# Altium footprint library RPSLib_orignal.PcbLib: 199 footprints (part 6 of 13)
Each footprint in its own frame and in the unit in brackets; x right, y up, seen from the top. Pads: shape width x height; smd on the part's side, far side on the other; paste and mask are expansions set on the pad; w line width, h text height; cw(c..) or ccw(c..) is an arc to the next point about the centre after c.
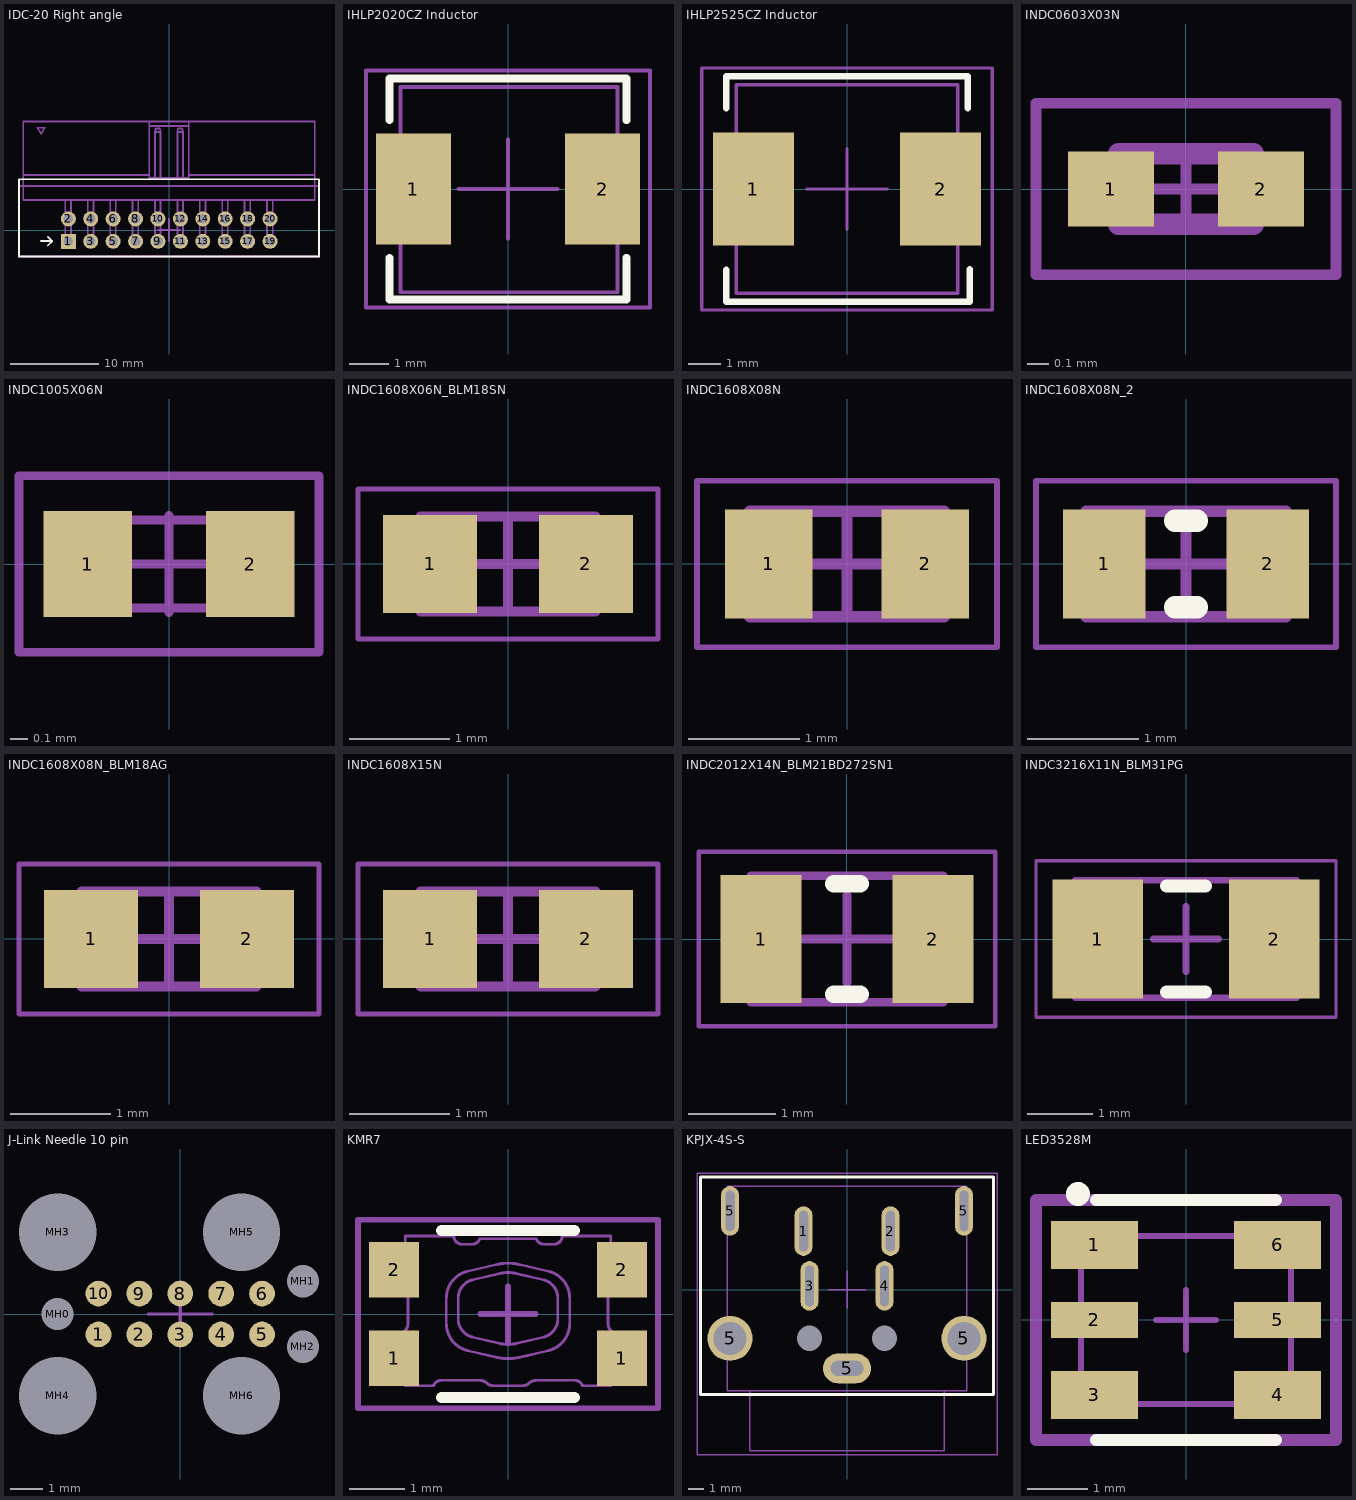
[diagram p5: the footprints below, top view; thin cyan lines are the x and y axes]

## IDC-20 Right angle [mm] "2.54 мм разъем правый"
height 9.1
pads (20):
  rect 1.7x1.7 hole 1.1: 1(-11.41,-1.27)
  round 1.7 hole 1.1: 2(-11.41,1.27) 3(-8.87,-1.27) 4(-8.87,1.27) 5(-6.33,-1.27) 6(-6.33,1.27) 7(-3.79,-1.27) 8(-3.79,1.27) 9(-1.25,-1.27) 10(-1.25,1.27) 11(1.29,-1.27) 12(1.29,1.27) 13(3.83,-1.27) 14(3.83,1.27) 15(6.37,-1.27) 16(6.37,1.27) 17(8.91,-1.27) 18(8.91,1.27) 19(11.45,-1.27) 20(11.45,1.27)
Top Overlay:
  lines w0.2: -14.5,-1.25 -13.25,-1.25 ; -13.75,-1.75 -13.25,-1.25 ; -13.75,-0.75 -13.25,-1.25 ; -17,-3 17,-3 17,5.75 -17,5.75 -17,-3
Mechanical 13:
  lines w0.2: -16.51,6.25 -2.25,6.25 ; -11.75,3.41 -11.75,-0.65 -11.75,-1.59 -11.11,-1.59 -11.11,-0.65 -11.11,3.41 ; -9.21,3.41 -9.21,-0.65 -9.21,-1.59 -8.57,-1.59 -8.57,-0.65 -8.57,3.41 ; -6.67,3.41 -6.67,-0.65 -6.67,-1.59 -6.03,-1.59 -6.03,-0.65 -6.03,3.41 ; -4.13,3.41 -4.13,-0.65 -4.13,-1.59 -3.49,-1.59 -3.49,-0.65 -3.49,3.41 ; -2.25,11.81 2.25,11.81 ; -1.59,3.41 -1.59,-0.65 -1.59,-1.59 -0.95,-1.59 -0.95,-0.65 -0.95,3.41 ; -1.59,5.91 -1.59,11.11 ; -0.95,5.91 -0.95,11.11 ; 0.95,3.41 0.95,-0.65 0.95,-1.59 1.59,-1.59 1.59,-0.65 1.59,3.41 ; 0.95,5.91 0.95,11.11 ; 1.59,5.91 1.59,11.11 ; 2.25,6.25 16.51,6.25 ; 3.49,3.41 3.49,-0.65 3.49,-1.59 4.13,-1.59 4.13,-0.65 4.13,3.41 ; 6.03,3.41 6.03,-0.65 6.03,-1.59 6.67,-1.59 6.67,-0.65 6.67,3.41 ; 8.57,3.41 8.57,-0.65 8.57,-1.59 9.21,-1.59 9.21,-0.65 9.21,3.41 ; 11.11,3.41 11.11,-0.65 11.11,-1.59 11.75,-1.59 11.75,-0.65 11.75,3.41 ; -2.25,12.31 -16.51,12.31 -16.51,3.41 16.51,3.41 16.51,12.31 2.25,12.31 ; -2.25,12.31 2.25,12.31 ; -2.25,12.31 -2.25,5.91 2.25,5.91 2.25,12.31 ; -1.59,11.11 -1.49,11.51 -1.05,11.51 -0.95,11.11 ; -1.59,11.11 -0.95,11.11 ; 0.95,11.11 1.05,11.51 1.49,11.51 1.59,11.11 ; 0.95,11.11 1.59,11.11 ; -14.91,11.61 -14.06,11.61 -14.485,10.874 -14.91,11.61
Mechanical 15:
  lines w0.2: -1.25,0 1.25,0 ; 0,-1.25 0,1.25 ; -17,-3 -17,5 17,5 17,-3 -17,-3
3D body "IDC-20 Right angle v2.stp": height 9, standoff -2.8, extent -16.51,-1.59 16.51,12.31

## IHLP2020CZ Inductor [mm]
height 3
pads (2):
  rect 1.9x2.8 smd mask+0.07: 1(-2.4,0) 2(2.4,0)
Top Overlay:
  lines w0.2: -3,-1.75 -3,-2.8 3,-2.8 3,-1.743 ; -3,1.75 -3,2.8 3,2.8 3,1.743
Mechanical 13:
  lines w0.1: -2.724,-2.615 2.776,-2.615 2.776,2.585 -2.724,2.585 -2.724,-2.615
Mechanical 15:
  lines w0.1: -1.25,0 1.25,0 ; 0,-1.25 0,1.25 ; -3.6,-3 -3.6,3 3.6,3 3.6,-3 -3.6,-3
3D body "User Library-IHLP2020CZ.step": height 3, standoff 0, extent -2.724,-2.615 2.776,2.585

## IHLP2525CZ Inductor [mm]
height 3
pads (2):
  rect 2.5x3.5 smd mask+0.07: 1(-2.9,0) 2(2.9,0)
Top Overlay:
  lines w0.2: -3.75,-2.5 -3.75,-3.5 3.801,-3.5 ; -3.75,2.5 -3.75,3.5 3.75,3.5 3.75,2.5 ; 3.801,-3.493 3.801,-2.493
Mechanical 13:
  lines w0.1: -3.43,-3.235 3.43,-3.235 3.43,3.235 -3.43,3.235 -3.43,-3.235
Mechanical 15:
  lines w0.1: -1.25,0 1.25,0 ; 0,-1.25 0,1.25 ; -4.5,-3.75 -4.5,3.75 4.5,3.75 4.5,-3.75 -4.5,-3.75
3D body "User Library-IHLP-2525CZ.step": height 3, standoff 0, extent -3.43,-3.235 3.43,3.235

## INDC0603X03N [mm] "Chip Inductor, 2-Leads, Body 0.60x0.30mm, IPC Medium Density"
height 0.3
pads (2):
  rect 0.4x0.35 smd paste-1: 1(-0.35,0) 2(0.35,0)
Top Paste:
  region: -0.45,-0.15 -0.46,-0.15 -0.478,-0.142 -0.492,-0.128 -0.5,-0.11 -0.5,-0.1 -0.5,0.1 -0.5,0.11 -0.492,0.128 -0.478,0.142 -0.46,0.15 -0.45,0.15 -0.225,0.15 -0.215,0.15 -0.197,0.142 -0.183,0.128 -0.175,0.11 -0.175,0.1 -0.175,-0.1 -0.175,-0.11 -0.183,-0.128 -0.197,-0.142 -0.215,-0.15 -0.225,-0.15
  region: 0.45,0.15 0.46,0.15 0.478,0.142 0.492,0.128 0.5,0.11 0.5,0.1 0.5,-0.1 0.5,-0.11 0.492,-0.128 0.478,-0.142 0.46,-0.15 0.45,-0.15 0.225,-0.15 0.215,-0.15 0.197,-0.142 0.183,-0.128 0.175,-0.11 0.175,-0.1 0.175,0.1 0.175,0.11 0.183,0.128 0.197,0.142 0.215,0.15 0.225,0.15
Mechanical 13:
  lines w0.1: -0.315,-0.165 0.315,-0.165 0.315,0.165 -0.315,0.165 -0.315,-0.165
Mechanical 15:
  lines w0.05: -0.165,0 0.165,0 ; 0,-0.165 0,0.165 ; -0.7,-0.4 0.7,-0.4 0.7,0.4 -0.7,0.4 -0.7,-0.4
3D body "INDC0603X03N.step": height 0.3, standoff 0, extent -0.315,-0.165 0.315,0.165

## INDC1005X06N [mm] "Chip Inductor, 2-Leads, Body 1.00x0.50mm, IPC Medium Density"
height 0.55
pads (2):
  rect 0.5x0.6 smd paste-0.05 mask+0.07: 1(-0.46,0) 2(0.46,0)
Mechanical 13:
  lines w0.05: -0.5,-0.25 -0.5,0.25 0.5,0.25 0.5,-0.25 -0.5,-0.25
Mechanical 15:
  lines w0.05: -0.275,0 0.275,0 ; 0,-0.275 0,0.275 ; -0.85,-0.5 -0.85,0.5 0.85,0.5 0.85,-0.5 -0.85,-0.5
3D body "INDC1005X05L.step": height 0.5, standoff 0, extent -0.5,-0.25 0.5,0.25

## INDC1608X06N_BLM18SN [mm] "Chip Inductor, 2-Leads, Body 1,60x0,80mm, IPC Medium Density"
height 0.6
pads (2):
  rect 0.94x0.98 smd: 1(-0.78,0) 2(0.78,0)
Mechanical 13:
  lines w0.1: -0.875,-0.475 -0.875,0.475 0.875,0.475 0.875,-0.475 -0.875,-0.475
Mechanical 15:
  lines w0.05: -1.5,-0.75 -1.5,0.75 1.5,0.75 1.5,-0.75 -1.5,-0.75
  lines w0.1: -0.475,0 0.475,0 ; 0,-0.475 0,0.475
3D body "INDC1608X06N_BLM18SN.step": height 0.6, standoff 0, extent -0.875,-0.475 0.875,0.475

## INDC1608X08N [mm] "Chip Inductor, 2-Leads, Body 1.60x0.80mm, IPC Medium Density"
height 0.8
pads (2):
  rect 0.79x0.98 smd paste-0.04 mask+0.07: 1(-0.705,0) 2(0.705,0)
Mechanical 13:
  lines w0.1: -0.875,-0.475 -0.875,0.475 0.875,0.475 0.875,-0.475 -0.875,-0.475
Mechanical 15:
  lines w0.05: -1.35,-0.75 -1.35,0.75 1.35,0.75 1.35,-0.75 -1.35,-0.75
  lines w0.1: -0.475,0 0.475,0 ; 0,-0.475 0,0.475
3D body "INDC1608X08N.step": height 0.8, standoff 0, extent -0.875,-0.475 0.875,0.475

## INDC1608X08N_2 [mm] "Chip Inductor, 2-Leads, Body 1.60x0.80mm, IPC Medium Density"
height 0.8
pads (2):
  rect 0.74x0.98 smd: 1(-0.735,0) 2(0.735,0)
Top Overlay:
  lines w0.2: -0.1,-0.39 0.1,-0.39 ; -0.1,0.39 0.1,0.39
Mechanical 13:
  lines w0.1: -0.9,-0.475 -0.9,0.475 0.9,0.475 0.9,-0.475 -0.9,-0.475
Mechanical 15:
  lines w0.05: -1.35,-0.75 -1.35,0.75 1.35,0.75 1.35,-0.75 -1.35,-0.75
  lines w0.1: -0.475,0 0.475,0 ; 0,-0.475 0,0.475
3D body "INDC1608X08N_2.step": height 0.8, standoff 0, extent -0.9,-0.475 0.9,0.475

## INDC1608X08N_BLM18AG [mm] "Chip Inductor, 2-Leads, Body 1,60x0,80mm, IPC Medium Density"
height 0.8
pads (2):
  rect 0.94x0.98 smd: 1(-0.78,0) 2(0.78,0)
Mechanical 13:
  lines w0.1: -0.875,-0.475 -0.875,0.475 0.875,0.475 0.875,-0.475 -0.875,-0.475
Mechanical 15:
  lines w0.05: -1.5,-0.75 -1.5,0.75 1.5,0.75 1.5,-0.75 -1.5,-0.75
  lines w0.1: -0.475,0 0.475,0 ; 0,-0.475 0,0.475
3D body "INDC1608X08N_BLM18AG.step": height 0.8, standoff 0, extent -0.875,-0.475 0.875,0.475

## INDC1608X15N [mm] "Chip Inductor, 2-Leads, Body 1,60x0,80mm, IPC Medium Density"
height 1.5
pads (2):
  rect 0.94x0.98 smd: 1(-0.78,0) 2(0.78,0)
Mechanical 13:
  lines w0.1: -0.875,-0.475 -0.875,0.475 0.875,0.475 0.875,-0.475 -0.875,-0.475
Mechanical 15:
  lines w0.05: -1.5,-0.75 -1.5,0.75 1.5,0.75 1.5,-0.75 -1.5,-0.75
  lines w0.1: -0.475,0 0.475,0 ; 0,-0.475 0,0.475
3D body "INDC1608X15N.step": height 1.5, standoff 0, extent -0.875,-0.475 0.875,0.475

## INDC2012X14N_BLM21BD272SN1 [mm] "Chip Inductor, 2-Leads, Body 2,00x1,25mm, IPC Medium Density"
height 1.45
pads (2):
  rect 0.93x1.47 smd: 1(-0.985,0) 2(0.985,0)
Top Overlay:
  lines w0.2: -0.15,-0.635 0.15,-0.635 ; -0.15,0.635 0.15,0.635
Mechanical 13:
  lines w0.1: -1.1,-0.725 1.1,-0.725 1.1,0.725 -1.1,0.725 -1.1,-0.725
Mechanical 15:
  lines w0.05: -1.7,-1 1.7,-1 1.7,1 -1.7,1 -1.7,-1
  lines w0.1: -0.5,0 0.5,0 ; 0,-0.5 0,0.5
3D body "INDC2012X14N_ 21BD272SN1.step": height 1.45, standoff 0, extent -1.1,-0.725 1.1,0.725

## INDC3216X11N_BLM31PG [mm] "Chip Inductor, 2-Leads, Body 3,20x1,60mm, IPC Medium Density"
height 1.1
pads (2):
  rect 1.39x1.82 smd: 1(-1.355,0) 2(1.355,0)
Top Overlay:
  lines w0.2: -0.3,-0.81 0.3,-0.81 ; -0.3,0.81 0.3,0.81
Mechanical 13:
  lines w0.1: -1.7,-0.9 -1.7,0.9 1.7,0.9 1.7,-0.9 -1.7,-0.9
Mechanical 15:
  lines w0.05: -2.3,-1.2 -2.3,1.2 2.3,1.2 2.3,-1.2 -2.3,-1.2
  lines w0.1: -0.5,0 0.5,0 ; 0,-0.5 0,0.5
3D body "INDC3216X11N.step": height 1.1, standoff 0, extent -1.7,-0.9 1.7,0.9

## J-Link Needle 10 pin [mm]
pads (17):
  round 0.8 smd paste-1 mask+0.07: 1(-2.54,-0.635) 2(-1.27,-0.635) 3(0,-0.635) 4(1.27,-0.635) 5(2.54,-0.635) 6(2.54,0.635) 7(1.27,0.635) 8(0,0.635) 9(-1.27,0.635) 10(-2.54,0.635)
  round 0.8 hole 1 unplated mask+0.07: MH0(-3.81,0) MH1(3.81,1.016) MH2(3.81,-1.016)
  round 0.8 hole 2.4 unplated mask+0.07: MH3(-3.81,2.54) MH4(-3.81,-2.54) MH5(1.905,2.54) MH6(1.905,-2.54)
Mechanical 15:
  lines w0.1: -1,0 1,0 ; 0,-1 0,1

## KMR7 [mm] "Tactile button"
height 2.5
pads (4):
  rect 0.9x1 smd mask+0.07: 1(-2.05,-0.8) 1(2.05,-0.8) 2(-2.05,0.8) 2(2.05,0.8)
Top Overlay:
  lines w0.2: -1.2,-1.5 1.2,-1.5 ; -1.2,1.5 1.2,1.5
Mechanical 3:
  lines w0.1: -2.7,-1.7 -2.7,1.7 2.7,1.7 2.7,-1.7 -2.7,-1.7
Mechanical 13:
  drawing of 3054 lines, arcs and shapes, not listed
Mechanical 15:
  lines w0.1: -0.5,0 0.5,0 ; 0,-0.5 0,0.5
3D body "KMR7.stp": height 2.54, standoff -0.06, extent -2.3,-1.399 2.3,1.451

## KPJX-4S-S [mm]
pads (11):
  oval 1.2x3.3 hole 0.6 slot 2.7 at 90 deg: 1(-2.9,3.9) 2(2.9,3.9) 3(-2.5,0.25) 4(2.5,0.25) 5(-7.8,5.25) 5(7.8,5.25)
  round 3 hole 2.2: 5(-7.8,-3.25) 5(7.8,-3.25)
  oval 3.2x2 hole 2.2 slot 1 at 90 deg: 5(0,-5.25)
  oval 0.8x0.725 hole 1.7 unplated mask+0.07: MH0(-2.5,-3.25) MH1(2.5,-3.25)
Top Overlay:
  lines w0.2: -9.75,-7 9.75,-7 9.75,7.5 -9.75,7.5 -9.75,-7
Mechanical 13:
  lines w0.1: -6.5,-6.75 -8,-6.75 -8,6.9 8,6.9 8,-6.75 6.5,-6.75 ; -6.5,-6.75 -6.5,-10.75 6.5,-10.75 6.5,-6.75 ; -6.5,-6.75 6.5,-6.75
Mechanical 15:
  lines w0.1: -1.25,0 1.25,0 ; 0,-1.25 0,1.25 ; -10,-11 -10,7.75 10,7.75 10,-11 -10,-11
3D body "KPJX-4S-S.stp": height 15, standoff -3.5, extent -8,-10.75 8,6.9

## LED3528M [mm] "SMD LED 3.5x2.8 mm, 0.6mm height"
height 0.6
pads (6):
  rect 1.45x0.8 smd mask+0.07: 1(-1.525,1.25) 3(-1.525,-1.25) 4(1.525,-1.25) 6(1.525,1.25)
  rect 1.45x0.6 smd mask+0.07: 2(-1.525,0) 5(1.525,0)
Top Overlay:
  circle w0.2: c-1.8,2.1 r0.1
  lines w0.2: -1.5,-2 1.5,-2 ; -1.5,2 1.5,2
Mechanical 13:
  lines w0.1: -1.75,-1.4 -1.75,1.4 1.75,1.4 1.75,-1.4 -1.75,-1.4
Mechanical 15:
  lines w0.1: -0.5,0 0.5,0 ; 0,-0.5 0,0.5
  lines w0.2: -2.5,-2 -2.5,2 2.5,2 2.5,-2 -2.5,-2
3D body "LED3528M.stp": height 0.6, standoff -0.01, extent -1.75,-1.4 1.75,1.4